# Altium footprint library Dr.Xiong_20160818.PcbLib: 266 footprints (part 1 of 17)
Each footprint in its own frame and in the unit in brackets; x right, y up, seen from the top. Pads: shape width x height; smd on the part's side, far side on the other; paste and mask are expansions set on the pad; w line width, h text height; cw(c..) or ccw(c..) is an arc to the next point about the centre after c.
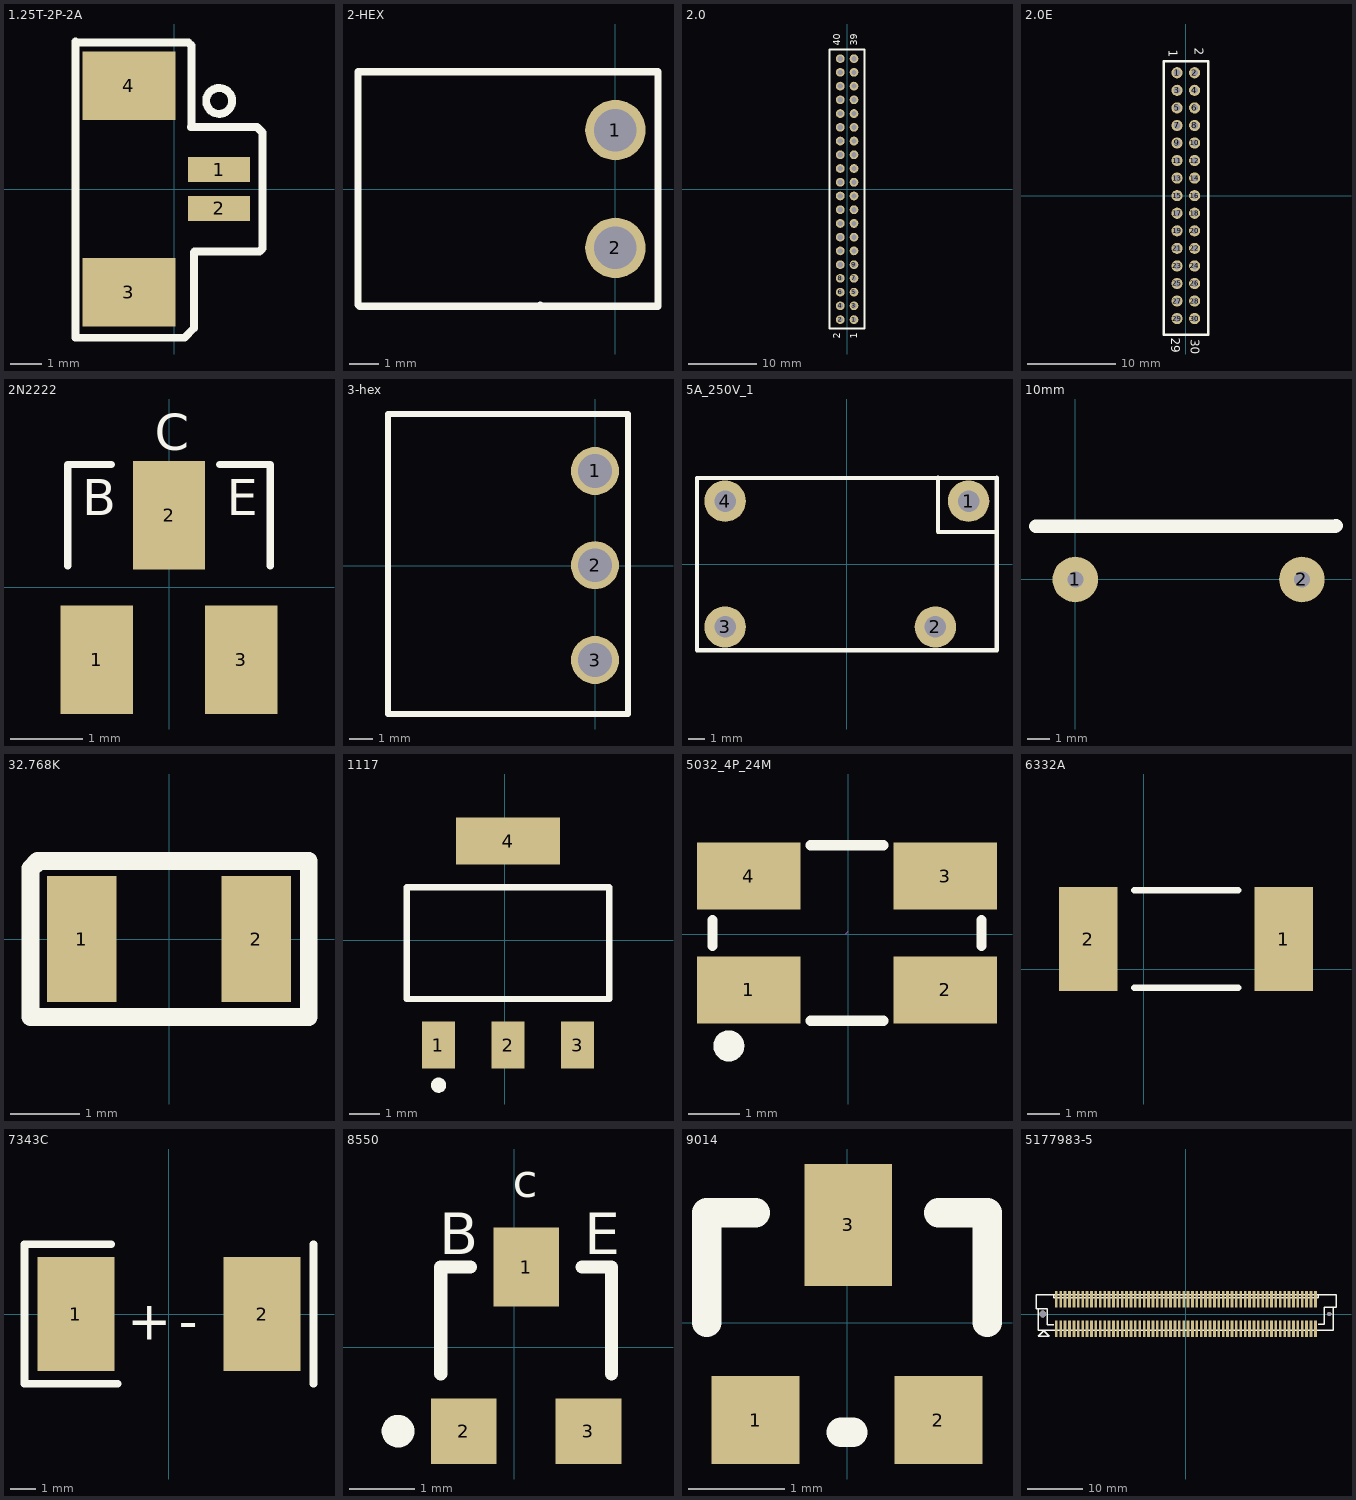
[diagram p0: the footprints below, top view; thin cyan lines are the x and y axes]

## 1.25T-2P-2A [mm]
pads (4):
  rect 2x0.8 smd: 1(1.45,0.625) 2(1.45,-0.625)
  rect 3x2.2 smd: 3(-1.45,-3.325) 4(-1.45,3.325)
Top Overlay:
  circle w0.254: c1.45,2.835 r0.417
  lines w0.254: -3.173,4.714 0.459,4.714 0.561,4.613 0.561,2.022 0.536,1.997 2.669,1.997 2.847,1.819 2.847,-1.915 2.745,-2.017 0.663,-2.017 0.637,-2.042 0.637,-4.48 0.332,-4.785 -3.173,-4.785 -3.173,4.74

## 2-HEX [mil]
pads (2):
  round 81 hole 57: 1(0,79) 2(0,-79)
Top Overlay:
  lines w10: -101,-156 -100,-157 ; -100,-157 -343,-157 -345,-155 -345,157 -99,157 57,157 57,-157 -100,-157

## 2.0 [mm]
pads (40):
  round 1.27 hole 0.762: 1(1,-19) 2(-1,-19) 3(1,-17) 4(-1,-17) 5(1,-15) 6(-1,-15) 7(1,-13) 8(-1,-13) 9(1,-11) 10(-1,-11) 11(1,-9) 12(-1,-9) 13(1,-7) 14(-1,-7) 15(1,-5) 16(-1,-5) 17(1,-3) 18(-1,-3) 19(1,-1) 20(-1,-1) 21(1,1) 22(-1,1) 23(1,3) 24(-1,3) 25(1,5) 26(-1,5) 27(1,7) 28(-1,7) 29(1,9) 30(-1,9) 31(1,11) 32(-1,11) 33(1,13) 34(-1,13) 35(1,15) 36(-1,15) 37(1,17) 38(-1,17) 39(1,19) 40(-1,19)
Top Overlay:
  lines w0.254: -2.556,-20.304 -2.556,20.336 2.524,20.336 2.524,-20.304 -2.556,-20.304
  text "1" at 1.508,-21.828 h1.02
  text "2" at -1.032,-21.828 h1.02
  text "39" at 1.508,20.844 h1.02
  text "40" at -1.032,20.844 h1.02

## 2.0E [mm]
pads (30):
  round 1.27 hole 0.762: 1(-1,14) 2(1,14) 3(-1,12) 4(1,12) 5(-1,10) 6(1,10) 7(-1,8) 8(1,8) 9(-1,6) 10(1,6) 11(-1,4) 12(1,4) 13(-1,2) 14(1,2) 15(-1,0) 16(1,0) 17(-1,-2) 18(1,-2) 19(-1,-4) 20(1,-4) 21(-1,-6) 22(1,-6) 23(-1,-8) 24(1,-8) 25(-1,-10) 26(1,-10) 27(-1,-12) 28(1,-12) 29(-1,-14) 30(1,-14)
Top Overlay:
  lines w0.254: -2.524,-15.85 2.556,-15.85 2.556,15.304 -2.524,15.304 -2.524,-15.85
  text "30" at 0.55,-16.325 h1.02
  text "29" at -1.65,-16.175 h1.02
  text "2" at 1.032,16.828 h1.02
  text "1" at -1.925,16.6 h1.02

## 2N2222 [mm]
pads (3):
  rect 1x1.5 smd: 1(-1,-1) 2(0,1) 3(1,-1)
Top Overlay:
  lines w0.1: -1.4,0.3 -1.4,1.7 -0.8,1.7 ; 0.7,1.7 1.4,1.7 1.4,0.3
  text "B" at -1.2,1 h0.5
  text "C" at -0.2,1.9 h0.5
  text "E" at 0.8,1 h0.5

## 3-hex [mil]
pads (3):
  round 80 hole 56: 1(0,157.5) 2(0,0.5) 3(0,-157.5)
Top Overlay:
  lines w10: -345,-247.5 -345,252.5 0,252.5 55,252.5 55,-247.5 0,-247.5 -345,-247.5

## 5A_250V_1 [mm]
pads (4):
  round 2.5 hole 1.3: 1(7.35,3.8) 2(5.35,-3.8) 3(-7.35,-3.8) 4(-7.35,3.8)
Top Overlay:
  lines w0.254: -9.05,-5.182 -9.05,5.182 ; -9.05,5.2 9.05,5.2 ; -9.042,-5.2 9.068,-5.2 ; 5.512,1.956 5.512,5.207 ; 5.537,1.93 9.042,1.93 ; 9.05,-5.182 9.05,5.207

## 10mm [mm]
pads (2):
  round 2 hole 0.7: 1(0,0) 2(9.957,0)
Top Overlay:
  lines w0.6: -1.727,2.337 11.43,2.337 11.455,2.362

## 32.768K [mm]
pads (2):
  rect 1x1.8 smd: 1(-1.25,0) 2(1.25,0)
Top Overlay:
  lines w0.254: -1.987,0.813 -1.987,1.016 -1.885,1.118 ; -1.885,1.118 -1.86,1.118 -1.987,0.991 -1.987,-1.118 2.001,-1.118 2.001,1.118 -1.885,1.118

## 1117 [mm]
pads (4):
  rect 1.1x1.55 smd: 1(-2.198,-3.477) 2(0.102,-3.477) 3(2.402,-3.477)
  rect 3.45x1.55 smd: 4(0.102,3.273)
Top Overlay:
  circle w0.25: c-2.198,-4.802 r0.125
  lines w0.2: -3.248,-1.952 -3.248,1.748 3.452,1.748 3.452,-1.952 -3.248,-1.952

## 5032_4P_24M [mm]
pads (4):
  rect 2x1.3 smd: 1(-1.921,-1.079) 2(1.879,-1.079) 3(1.879,1.121) 4(-1.921,1.121)
Top Overlay:
  lines w0.2: -2.622,-0.228 -2.622,0.27 ; -0.722,-1.679 0.68,-1.679 ; -0.722,1.72 0.68,1.72 ; 2.58,-0.228 2.58,0.27
  lines w0.3: -2.307,-2.011 ccw(c-2.306,-2.161) -2.304,-2.011
Mechanical 15:
  lines w0.003: -0.046,0.004 0.004,0.055

## 6332A [mm]
pads (2):
  rect 1.8x3.2 smd: 1(4.312,0.925) 2(-1.713,0.925)
Top Overlay:
  lines w0.2: -0.293,-0.569 2.907,-0.569 ; -0.293,2.431 2.907,2.431

## 7343C [mil]
pads (2):
  rect 120x177.17 smd: 1(-145,0) 2(145,0)
Top Overlay:
  lines w12: -90,108.58 -225,108.58 -225,-108.58 -80,-108.58 ; 225,-108.58 225,108.58
  text "-" at 15,-40 h60
  text "+" at -65,-40 h60

## 8550 [mm]
pads (3):
  rect 1x1.2 smd: 1(0.178,1.225)
  rect 1x1 smd: 2(-0.772,-1.275) 3(1.128,-1.275)
Top Overlay:
  circle w0.25: c-1.772,-1.275 r0.125
  lines w0.2: -1.122,-0.4 -1.122,1.225 -0.672,1.225 ; 1.028,1.225 1.478,1.225 1.478,-0.4
  text "c" at -0.025,2.286 h0.51
  text "B" at -1.143,1.422 h0.64
  text "E" at 1.067,1.422 h0.64

## 9014 [mil]
pads (3):
  rect 36x36 smd: 1(-37.5,-40) 2(37.5,-40)
  rect 36x50 smd: 3(0.5,40)
Top Overlay:
  lines w12: -57.5,0 -57.5,45 -37.5,45 ; -2.5,-45 2.5,-45 ; 37.5,45 57.5,45 57.5,0

## 5177983-5 [mm]
pads (120):
  rect 0.5x3 smd: 1(-23.6,-2.687) 2(-23.6,2.687) 3(-22.8,-2.687) 4(-22.8,2.687) 5(-22,-2.687) 6(-22,2.687) 7(-21.2,-2.687) 8(-21.2,2.687) 9(-20.4,-2.687) 10(-20.4,2.687) 11(-19.6,-2.687) 12(-19.6,2.687) 13(-18.8,-2.687) 14(-18.8,2.687) 15(-18,-2.687) 16(-18,2.687) 17(-17.2,-2.687) 18(-17.2,2.687) 19(-16.4,-2.687) 20(-16.4,2.687) 21(-15.6,-2.687) 22(-15.6,2.687) 23(-14.8,-2.687) 24(-14.8,2.687) 25(-14,-2.687) 26(-14,2.687) 27(-13.2,-2.687) 28(-13.2,2.687) 29(-12.4,-2.687) 30(-12.4,2.687) 31(-11.6,-2.687) 32(-11.6,2.687) 33(-10.8,-2.687) 34(-10.8,2.687) 35(-10,-2.687) 36(-10,2.687) 37(-9.2,-2.687) 38(-9.2,2.687) 39(-8.4,-2.687) 40(-8.4,2.687) 41(-7.6,-2.687) 42(-7.6,2.687) 43(-6.8,-2.687) 44(-6.8,2.687) 45(-6,-2.687) 46(-6,2.687) 47(-5.2,-2.687) 48(-5.2,2.687) 49(-4.4,-2.687) 50(-4.4,2.687) 51(-3.6,-2.687) 52(-3.6,2.687) 53(-2.8,-2.687) 54(-2.8,2.687) 55(-2,-2.687) 56(-2,2.687) 57(-1.2,-2.687) 58(-1.2,2.687) 59(-0.4,-2.687) 60(-0.4,2.687) 61(0.4,-2.687) 62(0.4,2.687) 63(1.2,-2.687) 64(1.2,2.687) 65(2,-2.687) 66(2,2.687) 67(2.8,-2.687) 68(2.8,2.687) 69(3.6,-2.687) 70(3.6,2.687) 71(4.4,-2.687) 72(4.4,2.687) 73(5.2,-2.687) 74(5.2,2.687) 75(6,-2.687) 76(6,2.687) 77(6.8,-2.687) 78(6.8,2.687) 79(7.6,-2.687) 80(7.6,2.687) 81(8.4,-2.687) 82(8.4,2.687) 83(9.2,-2.687) 84(9.2,2.687) 85(10,-2.687) 86(10,2.687) 87(10.8,-2.687) 88(10.8,2.687) 89(11.6,-2.687) 90(11.6,2.687) 91(12.4,-2.687) 92(12.4,2.687) 93(13.2,-2.687) 94(13.2,2.687) 95(14,-2.687) 96(14,2.687) 97(14.8,-2.687) 98(14.8,2.687) 99(15.6,-2.687) 100(15.6,2.687) 101(16.4,-2.687) 102(16.4,2.687) 103(17.2,-2.687) 104(17.2,2.687) 105(18,-2.687) 106(18,2.687) 107(18.8,-2.687) 108(18.8,2.687) 109(19.6,-2.687) 110(19.6,2.687) 111(20.4,-2.687) 112(20.4,2.687) 113(21.2,-2.687) 114(21.2,2.687) 115(22,-2.687) 116(22,2.687) 117(22.8,-2.687) 118(22.8,2.687) 119(23.6,-2.687) 120(23.6,2.687)
via 26.1,0 diameter 0.8 hole 0.8
via -26.1,0 diameter 1.2 hole 1.2
Top Overlay:
  lines w0.254: -27.305,3.124 -27.305,3.404 -27.203,3.505 24.232,3.505 ; -27.229,3.429 -27.305,3.353 -27.305,0.94 -26.822,0.94 -25.222,0.94 -25.222,-1.93 -25.197,-1.956 -24.079,-1.956 ; -26.9,0.94 -26.9,-3 26.872,-3 ; -24.079,3.429 -24.079,3 24.079,3 24.079,3.505 26.848,3.505 ; 24.13,-1.905 25.197,-1.905 ; 25.197,-1.753 25.197,-1.905 ; 26.594,1.194 27.356,1.194 27.356,3.454 27.305,3.505 26.645,3.505 ; 26.9,-3 26.9,1.194 25.197,1.194 25.197,1.168 25.197,-1.905 ; -26.899,-4.013 -25.933,-3.048 -25.883,-3.048 -24.917,-4.013 -26.899,-4.013